# Altium footprint library MB1404.PcbLib: 69 footprints (part 1 of 5)
Each footprint in its own frame and in the unit in brackets; x right, y up, seen from the top. Pads: shape width x height; smd on the part's side, far side on the other; paste and mask are expansions set on the pad; w line width, h text height; cw(c..) or ccw(c..) is an arc to the next point about the centre after c.
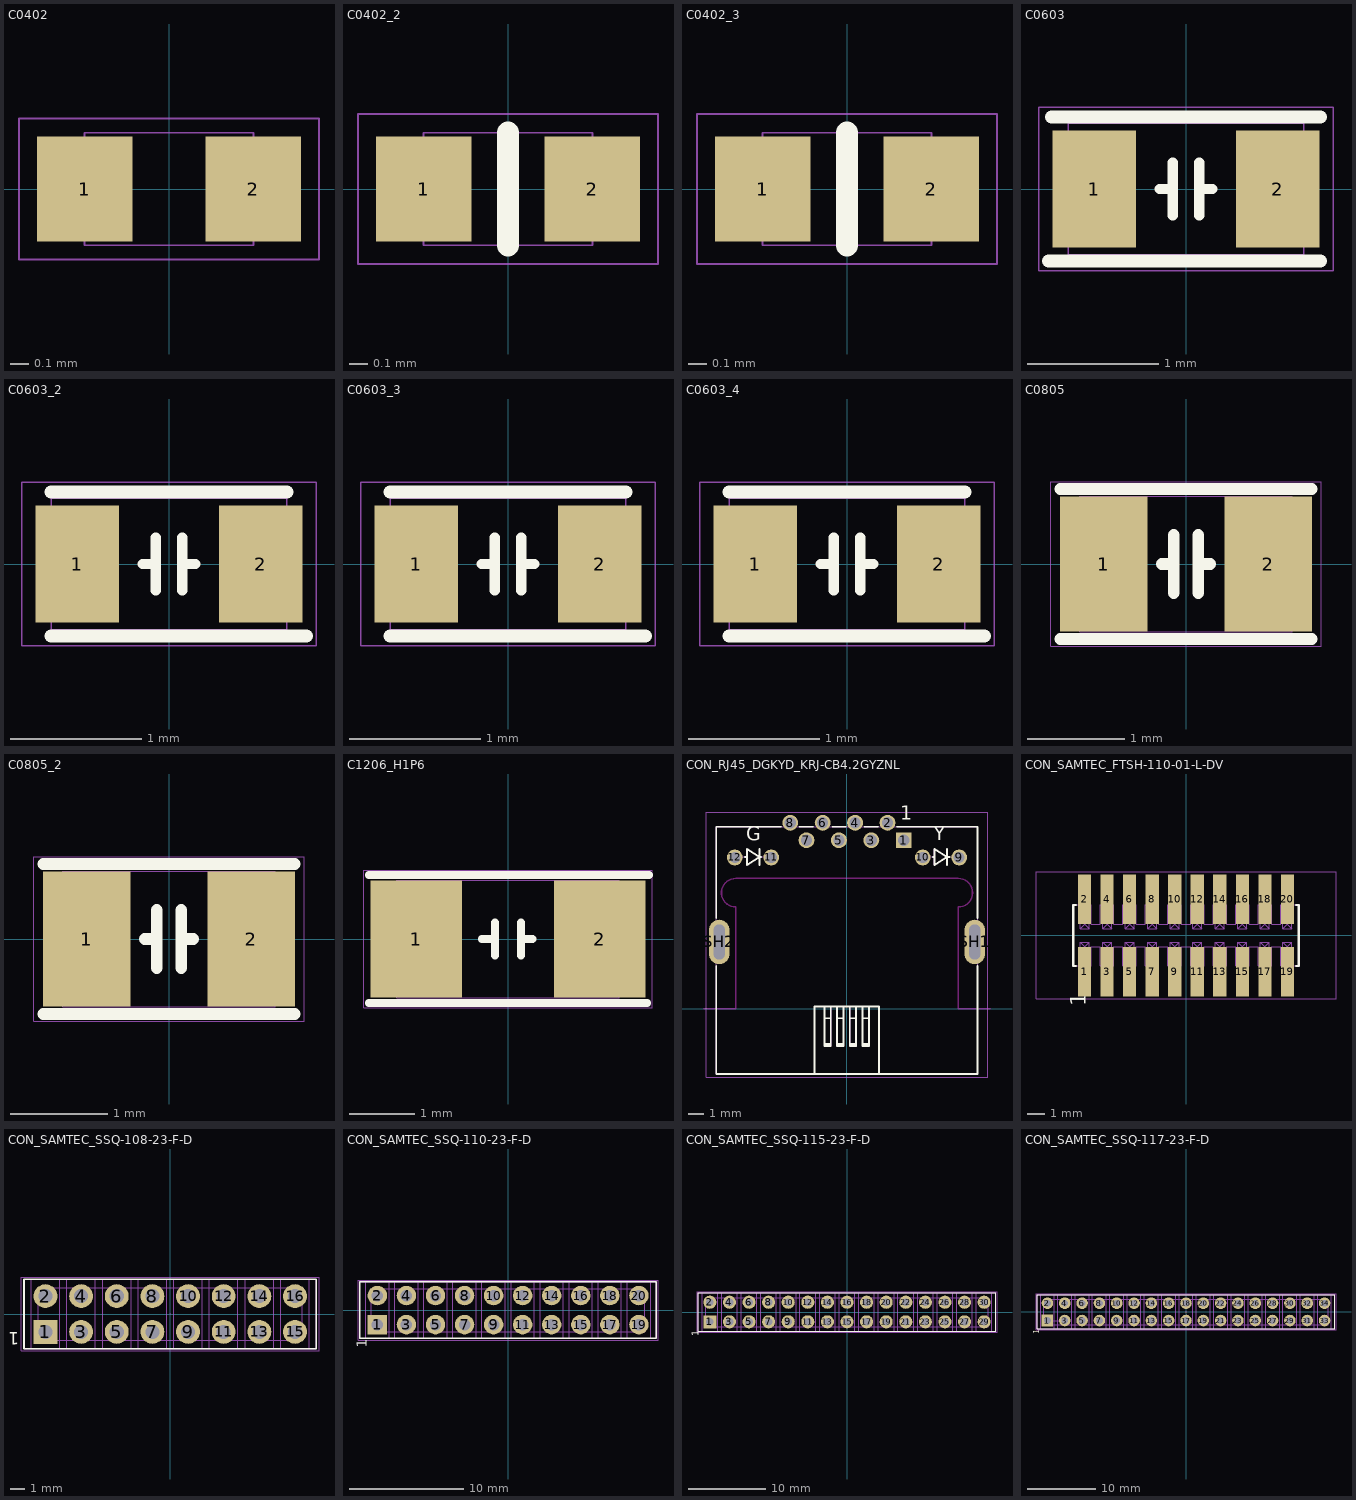
[diagram p0: the footprints below, top view; thin cyan lines are the x and y axes]

## C0402 [mm]
height 0.4
pads (2):
  rect 0.51x0.56 smd mask+0.05: 1(-0.45,0) 2(0.45,0)
Mechanical 14:
  lines w0.01: -0.45,-0.3 -0.45,0.3 0.45,0.3 0.45,-0.3 -0.45,-0.3
  text "'.Designator'" at 0,0 h0.75
Mechanical 16:
  lines w0.01: -0.8,-0.375 0.8,-0.375 0.8,0.375 -0.8,0.375 -0.8,-0.375
3D body: height 0.4, standoff 0, extent -0.455,-0.305 0.455,0.305
3D body "C0402.STEP": height 0.36, standoff 0, extent -0.5,-0.265 0.5,0.265

## C0402_2 [mm]
pads (2):
  rect 0.51x0.56 smd mask+0.05: 1(-0.45,0) 2(0.45,0)
Top Overlay:
  lines w0.12: 0,-0.3 0,0.3
Mechanical 14:
  lines w0.01: -0.45,-0.3 -0.45,0.3 0.45,0.3 0.45,-0.3 -0.45,-0.3
  text "'.Designator'" at 4.716,0.829 h0.75
Mechanical 16:
  lines w0.01: -0.8,-0.4 0.8,-0.4 0.8,0.4 -0.8,0.4 -0.8,-0.4
3D body: height 0.4, standoff 0, extent -0.455,-0.305 0.455,0.305
3D body "C0402.STEP": height 0.36, standoff 0, extent -0.5,-0.265 0.5,0.265

## C0402_3 [mm]
pads (2):
  rect 0.51x0.56 smd mask+0.05: 1(-0.45,0) 2(0.45,0)
Top Overlay:
  lines w0.12: 0,-0.3 0,0.3
Mechanical 14:
  lines w0.01: -0.45,-0.3 -0.45,0.3 0.45,0.3 0.45,-0.3 -0.45,-0.3
  text "'.Designator'" at 4.591,0.804 h0.75
Mechanical 16:
  lines w0.01: -0.8,-0.4 0.8,-0.4 0.8,0.4 -0.8,0.4 -0.8,-0.4
3D body: height 0.4, standoff 0, extent -0.455,-0.305 0.455,0.305
3D body "C0402.STEP": height 0.36, standoff 0, extent -0.5,-0.265 0.5,0.265

## C0603 [mm]
height 1.4
pads (2):
  rect 0.64x0.89 smd mask+0.05: 1(-0.7,0) 2(0.7,0)
Top Overlay:
  lines w0.08: -0.2,0 -0.1,0 ; -0.1,-0.2 -0.1,0.2 ; 0.1,-0.2 0.1,0.2 ; 0.1,0 0.2,0
  lines w0.1: -1.05,-0.55 1.025,-0.55 ; -1.025,0.55 1.025,0.55
Mechanical 14:
  lines w0.01: -0.9,-0.5 0.9,-0.5 0.9,0.5 -0.9,0.5 -0.9,-0.5
  text "'.Designator'" at -4.475,-0.75 h0.75
Mechanical 16:
  lines w0.01: -1.125,-0.625 -1.125,0.625 1.125,0.625 1.125,-0.625 -1.125,-0.625
3D body: height 1.4, standoff 0, extent -0.899,-0.499 0.899,0.499
3D body "C0603.STEP": height 0.5, standoff 0, extent -0.8,-0.4 0.8,0.4

## C0603_2 [mm]
pads (2):
  rect 0.64x0.89 smd mask+0.05: 1(-0.7,0) 2(0.7,0)
Top Overlay:
  lines w0.08: -0.2,0 -0.1,0 ; -0.1,-0.2 -0.1,0.2 ; 0.1,-0.2 0.1,0.2 ; 0.1,0 0.2,0
  lines w0.1: -0.9,-0.55 1.05,-0.55 ; -0.9,0.55 0.9,0.55
Mechanical 14:
  lines w0.01: -0.9,-0.5 -0.9,0.5 0.9,0.5 0.9,-0.5 -0.9,-0.5
  text "'.Designator'" at -4.5,-0.85 h0.75
Mechanical 16:
  lines w0.01: -1.125,-0.625 1.125,-0.625 1.125,0.625 -1.125,0.625 -1.125,-0.625
3D body "C0603.STEP": height 0.5, standoff 0, extent -0.8,-0.4 0.8,0.4
3D body: height 1.4, standoff 0, extent -0.899,-0.499 0.899,0.499

## C0603_3 [mm]
pads (2):
  rect 0.64x0.89 smd mask+0.05: 1(-0.7,0) 2(0.7,0)
Top Overlay:
  lines w0.08: -0.2,0 -0.1,0 ; -0.1,-0.2 -0.1,0.2 ; 0.1,-0.2 0.1,0.2 ; 0.1,0 0.2,0
  lines w0.1: -0.9,-0.55 1.05,-0.55 ; -0.9,0.55 0.9,0.55
Mechanical 14:
  lines w0.01: -0.9,-0.5 -0.9,0.5 0.9,0.5 0.9,-0.5 -0.9,-0.5
  text "'.Designator'" at -4.6,-0.875 h0.75
Mechanical 16:
  lines w0.01: -1.125,-0.625 1.125,-0.625 1.125,0.625 -1.125,0.625 -1.125,-0.625
3D body "C0603.STEP": height 0.5, standoff 0, extent -0.8,-0.4 0.8,0.4
3D body: height 1.4, standoff 0, extent -0.899,-0.499 0.899,0.499

## C0603_4 [mm]
pads (2):
  rect 0.64x0.89 smd mask+0.05: 1(-0.7,0) 2(0.7,0)
Top Overlay:
  lines w0.08: -0.2,0 -0.1,0 ; -0.1,-0.2 -0.1,0.2 ; 0.1,-0.2 0.1,0.2 ; 0.1,0 0.2,0
  lines w0.1: -0.9,-0.55 1.05,-0.55 ; -0.9,0.55 0.9,0.55
Mechanical 14:
  lines w0.01: -0.9,-0.5 -0.9,0.5 0.9,0.5 0.9,-0.5 -0.9,-0.5
  text "'.Designator'" at 4.391,0.879 h0.75
Mechanical 16:
  lines w0.01: -1.125,-0.625 1.125,-0.625 1.125,0.625 -1.125,0.625 -1.125,-0.625
3D body "C0603.STEP": height 0.5, standoff 0, extent -0.8,-0.4 0.8,0.4
3D body: height 1.4, standoff 0, extent -0.899,-0.499 0.899,0.499

## C0805 [mm]
height 1.35
pads (2):
  rect 0.9x1.4 smd mask+0.05: 1(-0.85,0) 2(0.85,0)
Top Overlay:
  lines w0.12: -1.3,-0.775 1.3,-0.775 ; -1.3,0.775 1.3,0.775 ; -0.25,0 -0.15,0 ; -0.125,-0.3 -0.125,0.3 ; 0.125,-0.3 0.125,0.3 ; 0.15,0 0.25,0
Mechanical 14:
  lines w0.01: -1.1,-0.7 1.1,-0.7 1.1,0.7 -1.1,0.7 -1.1,-0.7
  text "'.Designator'" at -2,-0.5 h0.75
Mechanical 16:
  lines w0.01: -1.4,-0.85 -1.4,0.85 1.4,0.85 1.4,-0.85 -1.4,-0.85
3D body "C0805_2012D.STEP": height 1.25, standoff 0, extent -1,-0.625 1,0.625
3D body: height 1.35, standoff 0, extent -1.105,-0.705 1.105,0.705

## C0805_2 [mm]
pads (2):
  rect 0.9x1.4 smd mask+0.05: 1(-0.85,0) 2(0.85,0)
Top Overlay:
  lines w0.12: -1.3,-0.775 1.3,-0.775 ; -1.3,0.775 1.3,0.775 ; -0.25,0 -0.15,0 ; -0.125,-0.3 -0.125,0.3 ; 0.125,-0.3 0.125,0.3 ; 0.15,0 0.25,0
Mechanical 14:
  lines w0.01: -1.1,-0.7 1.1,-0.7 1.1,0.7 -1.1,0.7 -1.1,-0.7
  text "'.Designator'" at -4.491,-0.774 h0.75
Mechanical 16:
  lines w0.01: -1.4,-0.85 -1.4,0.85 1.4,0.85 1.4,-0.85 -1.4,-0.85
3D body "C0805_2012D.STEP": height 1.25, standoff 0, extent -1,-0.625 1,0.625
3D body: height 1.35, standoff 0, extent -1.105,-0.705 1.105,0.705

## C1206_H1P6 [mm]
height 1.8
pads (2):
  rect 1.4x1.78 smd mask+0.05: 1(-1.4,0) 2(1.4,0)
Top Overlay:
  lines w0.12: -2.125,-0.975 2.125,-0.975 ; -2.125,0.975 2.15,0.975 ; -0.4,0 -0.2,0 ; -0.2,-0.25 -0.2,0.25 ; 0.2,-0.25 0.2,0.25 ; 0.2,0 0.375,0
Mechanical 14:
  lines w0.01: -1.7,-0.9 -1.7,0.9 1.7,0.9 1.7,-0.9 -1.7,-0.9
  text "'.Designator'" at -4.525,-0.8 h0.75
Mechanical 16:
  lines w0.01: -2.2,-1.05 2.2,-1.05 2.2,1.05 -2.2,1.05 -2.2,-1.05
3D body "C1206_H1P6.STEP": height 1.6, standoff 0, extent -1.64,-0.8 1.64,0.8
3D body: height 1.8, standoff 0, extent -1.705,-0.905 1.705,0.905

## CON_RJ45_DGKYD_KRJ-CB4.2GYZNL [mm] "RJ45  connector, right angle"
height 6.85
pads (14):
  rect 1x1 hole 0.7 mask+0.05: 1(3.57,10.6)
  round 1 hole 0.7 mask+0.05: 2(2.55,11.7) 3(1.53,10.6) 4(0.51,11.7) 5(-0.51,10.6) 6(-1.53,11.7) 7(-2.55,10.6) 8(-3.57,11.7) 9(7.06,9.52) 10(4.77,9.52) 11(-4.77,9.52) 12(-7.06,9.52)
  oval 1.3x2.8 hole 0.7 slot 2.2 at 90 deg mask+0.05: SH1(8.04,4.2) SH2(-8.04,4.2)
Top Overlay:
  lines w0.12: -8.23,2.7 -8.23,-4.1 8.22,-4.1 8.22,2.7 ; -8.23,5.7 -8.23,11.45 -4.155,11.45 ; -6.43,9.55 -6.3,9.55 ; -5.5,9.05 -5.5,10.05 ; -5.405,9.55 -5.5,9.55 ; -2.98,11.45 -2.13,11.45 ; -2.055,-4.1 -2.055,0.15 2.005,0.15 2.005,-4.1 ; -1.425,-2.225 -1.025,-2.225 ; -1.425,-0.6 -1.025,-0.6 ; -0.93,11.45 -0.08,11.45 ; -0.625,-2.225 -0.225,-2.225 ; -0.625,-0.6 -0.225,-0.6 ; 0.175,-2.225 0.575,-2.225 ; 0.175,-0.6 0.575,-0.6 ; 0.975,-2.225 1.375,-2.225 ; 0.975,-0.6 1.375,-0.6 ; 1.095,11.45 1.945,11.45 ; 3.145,11.45 8.22,11.45 8.22,5.7 ; 5.395,9.55 5.5,9.55 ; 6.3,9.05 6.3,10.05 ; 6.445,9.55 6.3,9.55 ; -5.5,9.55 -6.3,10.05 -6.3,9.05 -5.5,9.55 ; -1.425,-2.35 -1.425,0.15 -1.425,-2.35 ; -1.425,-2.35 -1.025,-2.35 ; -1.025,-2.35 -1.025,0.15 -1.025,-2.35 ; -0.625,-2.35 -0.625,0.15 -0.625,-2.35 ; -0.625,-2.35 -0.225,-2.35 ; -0.225,-2.35 -0.225,0.15 -0.225,-2.35 ; 0.175,-2.35 0.575,-2.35 ; 0.175,-2.35 0.175,0.15 0.175,-2.35 ; 0.575,-2.35 0.575,0.15 0.575,-2.35 ; 0.975,-2.35 1.375,-2.35 ; 0.975,-2.35 0.975,0.15 0.975,-2.35 ; 1.375,-2.35 1.375,0.15 1.375,-2.35 ; 6.3,9.55 5.5,9.05 5.5,10.05 6.3,9.55
  text "Y" at 5.47,10.275 h1.5
  text "G" at -6.33,10.25 h1.5
  text "1" at 3.345,11.575 h1.5
Keep-Out Layer:
  text "BOARD OUTLINE /  / CUT OUT" at -5.5,2.1 h1.52
Mechanical 7:
  text "EDGE" at 7,-1.2 h1.5
  text "PCB" at -9.6,-1.2 h1.5
  text "BOARD OUTLINE /  / CUT OUT" at -5.5,2.1 h1.52
Mechanical 14:
  lines w0.01: -8.225,3.125 -8.3,3.125 -8.3,5.275 -8.225,5.275 ; -7.2,9.55 -6.3,9.55 ; -5.5,9.05 -5.5,10.05 ; -4.8,9.55 -5.5,9.55 ; -2.03,-4.1 -2.03,0.15 2.03,0.15 2.03,-4.1 ; -1.4,-2.225 -1,-2.225 ; -1.4,-0.6 -1,-0.6 ; -0.6,-2.225 -0.2,-2.225 ; -0.6,-0.6 -0.2,-0.6 ; 0.2,-2.225 0.6,-2.225 ; 0.2,-0.6 0.6,-0.6 ; 1,-2.225 1.4,-2.225 ; 1,-0.6 1.4,-0.6 ; 4.6,9.55 5.5,9.55 ; 6.3,9.05 6.3,10.05 ; 7,9.55 6.3,9.55 ; 8.225,3.125 8.3,3.125 8.3,5.275 8.225,5.275 ; -5.5,9.55 -6.3,9.05 -6.3,10.05 -5.5,9.55 ; -1.4,-2.35 -1,-2.35 ; -1.4,-2.35 -1.4,0.15 -1.4,-2.35 ; -1,-2.35 -1,0.15 -1,-2.35 ; -0.6,-2.35 -0.2,-2.35 ; -0.6,-2.35 -0.6,0.15 -0.6,-2.35 ; -0.2,-2.35 -0.2,0.15 -0.2,-2.35 ; 0.2,-2.35 0.2,0.15 0.2,-2.35 ; 0.2,-2.35 0.6,-2.35 ; 0.6,-2.35 0.6,0.15 0.6,-2.35 ; 1,-2.35 1,0.15 1,-2.35 ; 1,-2.35 1.4,-2.35 ; 1.4,-2.35 1.4,0.15 1.4,-2.35 ; 6.3,9.55 5.5,10.05 5.5,9.05 6.3,9.55 ; -8.225,-4.1 8.225,-4.1 8.225,11.45 -8.225,11.45 -8.225,-4.1 ; -3.77,11.45 -3.37,11.45 -3.37,12.025 -3.77,12.025 -3.77,11.45 ; -1.73,11.45 -1.33,11.45 -1.33,12.025 -1.73,12.025 -1.73,11.45 ; 0.31,11.45 0.71,11.45 0.71,12.025 0.31,12.025 0.31,11.45 ; 2.35,11.45 2.75,11.45 2.75,12.025 2.35,12.025 2.35,11.45
  text "7" at -2.85,10.125 h1.5
  text "8" at -3.9,11 h1.5
  text "2" at 2.225,11 h1.5
  text "1" at 3.4,10.15 h1.5
  text "GREEN" at -7.2,8.35 h0.8
  text "YELLOW" at 4.4,8.35 h0.8
  text "'.Designator'" at -4.419,8.85 h0.75
Mechanical 16:
  lines w0.01: -8.85,-4.3 8.85,-4.3 8.85,12.35 -3.375,12.35 -8.325,12.35 -8.85,12.35 -8.85,3.375 -8.85,-4.3
Multi-Layer keep-out:
  lines w0.1: -9,0 -7,0 -7,6.4 cw(c-7,7.3) -7,8.2 7,8.2 cw(c7,7.3) 7,6.4 7,0 9,0
3D body: height 0, standoff -2.2, extent 7.69,3.2 8.39,5.2
3D body: height 0, standoff -2.2, extent -8.39,3.2 -7.69,5.2
3D body: height 0.2, standoff 0, extent 2.352,11.45 2.75,11.9
3D body: height 0.2, standoff 0, extent 0.312,11.45 0.71,11.9
3D body: height 0.2, standoff 0, extent -1.728,11.45 -1.33,11.9
3D body: height 0, standoff -2.2, extent -7.258,9.321 -6.86,9.72
3D body: height 0, standoff -2.2, extent -4.968,9.321 -4.57,9.72
3D body: height 0, standoff -2.2, extent 4.572,9.321 4.97,9.72
3D body: height 0, standoff -2.2, extent 6.862,9.321 7.26,9.72
3D body: height 0, standoff -2.2, extent -2.748,10.401 -2.35,10.8
3D body: height 0, standoff -2.2, extent -0.708,10.401 -0.31,10.8
3D body: height 0, standoff -2.2, extent 1.332,10.401 1.73,10.8
3D body: height 0, standoff -2.2, extent 3.372,10.401 3.77,10.8
3D body: height 0, standoff -2.2, extent 2.352,11.501 2.75,11.9
3D body: height 0, standoff -2.2, extent 0.312,11.501 0.71,11.9
3D body: height 0, standoff -2.2, extent -1.728,11.501 -1.33,11.9
3D body: height 0, standoff -2.2, extent -3.768,11.501 -3.37,11.9
3D body: height 0.2, standoff 0, extent -3.77,11.45 -3.37,11.9
3D body: height 0, standoff -4.2, extent -8.225,-4.1 8.225,-2.1
3D body: height 0, standoff -4.2, extent -8.225,-2.1 8.225,7.9
3D body: height 6.85, standoff 0, extent -8.225,-4.1 8.225,11.45

## CON_SAMTEC_FTSH-110-01-L-DV [mm]
height 5.97
pads (20):
  rect 0.74x2.79 smd mask+0.05: 1(-5.715,-2.035) 2(-5.715,2.035) 3(-4.445,-2.035) 4(-4.445,2.035) 5(-3.175,-2.035) 6(-3.175,2.035) 7(-1.905,-2.035) 8(-1.905,2.035) 9(-0.635,-2.035) 10(-0.635,2.035) 11(0.635,-2.035) 12(0.635,2.035) 13(1.905,-2.035) 14(1.905,2.035) 15(3.175,-2.035) 16(3.175,2.035) 17(4.445,-2.035) 18(4.445,2.035) 19(5.715,-2.035) 20(5.715,2.035)
Top Overlay:
  lines w0.12: -6.21,-1.714 -6.35,-1.714 -6.35,1.715 -6.21,1.715 ; 6.21,-1.715 6.35,-1.715 6.35,1.714 6.21,1.714
  text "1" at -5.34,-3.986 h1.5
Mechanical 14:
  drawing of 256 lines, arcs and shapes, not listed
  text "'.Designator'" at 2.085,0.489 h0.75
  text "2" at -5.925,2 h1
  text "19" at 5.325,-2.625 h1
  text "20" at 5.275,2 h1
  text "1" at -5.825,-2.625 h1
Mechanical 16:
  lines w0.01: -8.45,-3.58 8.45,-3.58 8.45,3.58 -8.45,3.58 -8.45,-3.58
3D body: height 5.97, standoff 0, extent -6.355,-1.725 6.355,1.725
3D body "FTSH-110-01-L-DV.stp": height 5.96, standoff -0.01, extent -6.35,-2.921 6.35,2.921

## CON_SAMTEC_SSQ-108-23-F-D [mm] "MCD-02951"
height 8.51
pads (16):
  rect 1.7x1.7 hole 1 mask+0.05: 1(-8.89,-1.27)
  round 1.7 hole 1 mask+0.05: 2(-8.89,1.27) 3(-6.35,-1.27) 4(-6.35,1.27) 5(-3.81,-1.27) 6(-3.81,1.27) 7(-1.27,-1.27) 8(-1.27,1.27) 9(1.27,-1.27) 10(1.27,1.27) 11(3.81,-1.27) 12(3.81,1.27) 13(6.35,-1.27) 14(6.35,1.27) 15(8.89,-1.27) 16(8.89,1.27)
Top Overlay:
  lines w0.12: -10.414,-2.476 10.414,-2.476 10.414,2.476 -10.414,2.476 -10.414,-2.476
  text "1" at -10.776,-1.011 h1.5
Mechanical 14:
  drawing of 286 lines, arcs and shapes, not listed
  text "1" at -9.15,-1.675 h1.5
  text "2" at -9.2,0.825 h1.5
  text "16" at 8.225,0.825 h1.5
  text "15" at 8.25,-1.675 h1.5
  text "'.Designator'" at -2,-0.5 h0.75
Mechanical 16:
  lines w0.01: -10.625,-2.625 10.6,-2.625 10.6,2.625 -10.625,2.625 -10.625,-2.625
3D body "SSQ-108-23-F-D.stp": height 8.51, standoff -10.01, extent -10.414,-2.477 10.414,2.476

## CON_SAMTEC_SSQ-110-23-F-D [mm] "MCD-02953"
height 8.51
pads (20):
  rect 1.7x1.7 hole 1 mask+0.05: 1(-11.43,-1.27)
  round 1.7 hole 1 mask+0.05: 2(-11.43,1.27) 3(-8.89,-1.27) 4(-8.89,1.27) 5(-6.35,-1.27) 6(-6.35,1.27) 7(-3.81,-1.27) 8(-3.81,1.27) 9(-1.27,-1.27) 10(-1.27,1.27) 11(1.27,-1.27) 12(1.27,1.27) 13(3.81,-1.27) 14(3.81,1.27) 15(6.35,-1.27) 16(6.35,1.27) 17(8.89,-1.27) 18(8.89,1.27) 19(11.43,-1.27) 20(11.43,1.27)
Top Overlay:
  lines w0.12: -12.954,-2.476 -12.954,2.476 12.954,2.476 12.954,-2.476 -12.954,-2.476
  text "1" at -12.047,-3.306 h1.5
Mechanical 14:
  drawing of 354 lines, arcs and shapes, not listed
  text "'.Designator'" at -2,-0.5 h0.75
  text "19" at 10.735,-1.679 h1.5
  text "20" at 10.71,0.821 h1.5
  text "2" at -11.735,0.796 h1.5
  text "1" at -11.685,-1.704 h1.5
Mechanical 16:
  lines w0.01: -13.125,-2.625 -13.125,2.625 13.1,2.625 13.1,-2.625 -13.125,-2.625
3D body "SSQ-110-23-F-D.stp": height 8.51, standoff -10.01, extent -12.954,-2.476 12.954,2.477

## CON_SAMTEC_SSQ-115-23-F-D [mm] "MCD-02952"
height 8.51
pads (30):
  rect 1.7x1.7 hole 1 mask+0.05: 1(-17.78,-1.27)
  round 1.7 hole 1 mask+0.05: 2(-17.78,1.27) 3(-15.24,-1.27) 4(-15.24,1.27) 5(-12.7,-1.27) 6(-12.7,1.27) 7(-10.16,-1.27) 8(-10.16,1.27) 9(-7.62,-1.27) 10(-7.62,1.27) 11(-5.08,-1.27) 12(-5.08,1.27) 13(-2.54,-1.27) 14(-2.54,1.27) 15(0,-1.27) 16(0,1.27) 17(2.54,-1.27) 18(2.54,1.27) 19(5.08,-1.27) 20(5.08,1.27) 21(7.62,-1.27) 22(7.62,1.27) 23(10.16,-1.27) 24(10.16,1.27) 25(12.7,-1.27) 26(12.7,1.27) 27(15.24,-1.27) 28(15.24,1.27) 29(17.78,-1.27) 30(17.78,1.27)
Top Overlay:
  lines w0.12: -19.304,-2.476 -19.304,2.476 19.304,2.476 19.304,-2.476 -19.304,-2.476
  text "1" at -18.901,-3.136 h1.5
Mechanical 14:
  drawing of 477 lines, arcs and shapes, not listed
  text "'.Designator'" at -2,-0.5 h0.75
  text "29" at 17.064,-1.713 h1.5
  text "30" at 17.039,0.787 h1.5
  text "2" at -18.064,0.799 h1.5
  text "1" at -18.014,-1.701 h1.5
Mechanical 16:
  lines w0.01: -19.45,-2.625 -19.45,2.625 19.45,2.625 19.45,-2.625 -19.45,-2.625
3D body "SSQ-115-23-F-D.stp": height 8.51, standoff -10.01, extent -19.304,-2.476 19.304,2.477

## CON_SAMTEC_SSQ-117-23-F-D [mm] "MCD-02954"
height 8.51
pads (34):
  rect 1.7x1.7 hole 1 mask+0.05: 1(-20.32,-1.27)
  round 1.7 hole 1 mask+0.05: 2(-20.32,1.27) 3(-17.78,-1.27) 4(-17.78,1.27) 5(-15.24,-1.27) 6(-15.24,1.27) 7(-12.7,-1.27) 8(-12.7,1.27) 9(-10.16,-1.27) 10(-10.16,1.27) 11(-7.62,-1.27) 12(-7.62,1.27) 13(-5.08,-1.27) 14(-5.08,1.27) 15(-2.54,-1.27) 16(-2.54,1.27) 17(0,-1.27) 18(0,1.27) 19(2.54,-1.27) 20(2.54,1.27) 21(5.08,-1.27) 22(5.08,1.27) 23(7.62,-1.27) 24(7.62,1.27) 25(10.16,-1.27) 26(10.16,1.27) 27(12.7,-1.27) 28(12.7,1.27) 29(15.24,-1.27) 30(15.24,1.27) 31(17.78,-1.27) 32(17.78,1.27) 33(20.32,-1.27) 34(20.32,1.27)
Top Overlay:
  lines w0.12: -21.844,-2.476 -21.844,2.476 21.844,2.476 21.844,-2.476 -21.844,-2.476
  text "1" at -21.211,-3.256 h1.5
Mechanical 14:
  drawing of 521 lines, arcs and shapes, not listed
  text "'.Designator'" at -2,-0.5 h0.75
  text "33" at 19.619,-1.708 h1.5
  text "34" at 19.594,0.792 h1.5
  text "2" at -20.649,0.804 h1.5
  text "1" at -20.599,-1.696 h1.5
Mechanical 16:
  lines w0.01: -22,-2.625 -22,2.625 22,2.625 22,-2.625 -22,-2.625
3D body "SSQ-117-23-F-D.stp": height 8.51, standoff -10.01, extent -21.844,-2.476 21.844,2.477